# Altium footprint library DBLib.PcbLib: 92 footprints (part 6 of 6)
Each footprint in its own frame and in the unit in brackets; x right, y up, seen from the top. Pads: shape width x height; smd on the part's side, far side on the other; paste and mask are expansions set on the pad; w line width, h text height; cw(c..) or ccw(c..) is an arc to the next point about the centre after c.
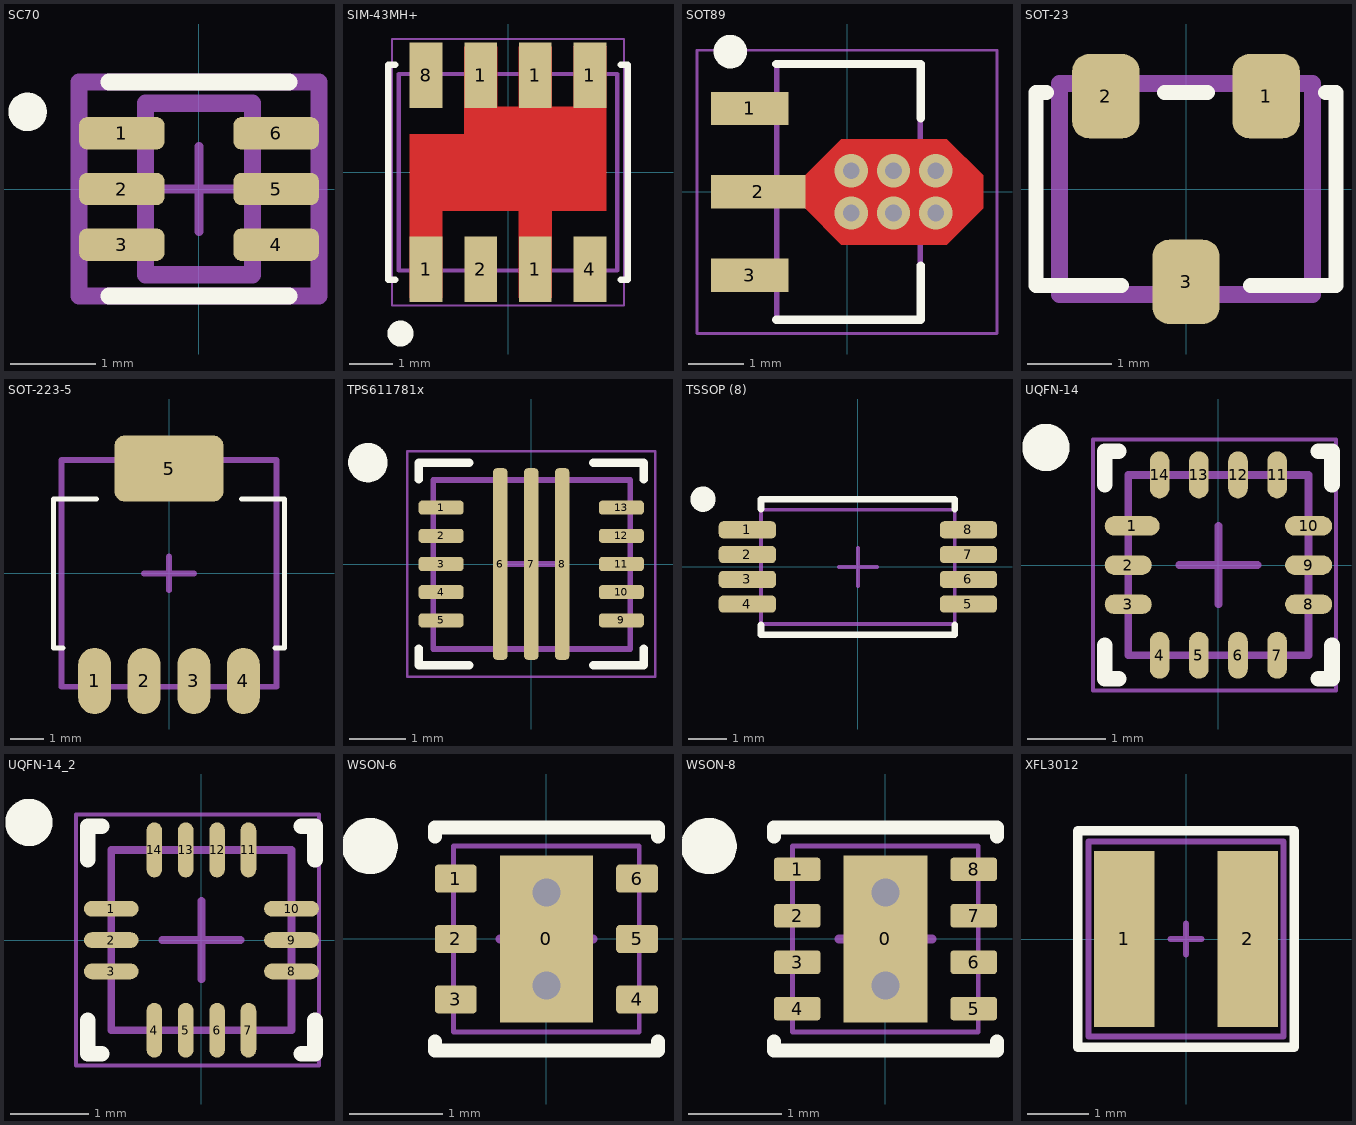
[diagram p5: the footprints below, top view; thin cyan lines are the x and y axes]

## SC70 [mm]
height 1
pads (6):
  rrect50% 1x0.376 smd paste+0 mask+0: 1(-0.9,0.65) 2(-0.9,0) 3(-0.9,-0.65) 4(0.9,-0.65) 5(0.9,0) 6(0.9,0.65)
Top Overlay:
  circle w0.25: c-2,0.9 r0.1
  lines w0.2: -1.05,-1.25 1.05,-1.25 ; -1.05,1.25 1.05,1.25
Mechanical 1:
  lines w0.2: -0.625,-1 0.625,-1 0.625,1 -0.625,1 -0.625,-1
Mechanical 13:
  lines w0.1: -0.5,0 0.5,0 ; 0,-0.5 0,0.5
  lines w0.2: -1.4,-1.25 -1.4,1.25 1.4,1.25 1.4,-1.25 -1.4,-1.25
3D body "IC_Analog_Devices_LT5534ESC6#TRMPBF_eec.STEP": height 1, standoff 0, extent -1.069,-1.003 1.031,0.997

## SIM-43MH+ [mm] "Frequency Mixer"
height 2.21
pads (8):
  rect 0.76x1.52 smd: 1(-1.905,-2.256) 1(-0.635,2.256) 1(0.635,-2.256) 1(0.635,2.256) 1(1.905,2.256) 2(-0.635,-2.256) 4(1.905,-2.256) 8(-1.905,2.256)
Top Layer:
  region: -1.016,2.921 -0.254,2.921 -0.254,1.524 0.254,1.524 0.254,2.921 1.016,2.921 1.016,1.524 1.524,1.524 1.524,2.921 2.286,2.921 2.286,-0.889 1.016,-0.889 1.016,-2.921 0.254,-2.921 0.254,-0.889 -1.524,-0.889 -1.524,-2.921 -2.286,-2.921 -2.286,0.889 -1.016,0.889
Top Overlay:
  circle w0.35: c-2.5,-3.75 r0.127
  lines w0.15: -2.626,-2.5 -2.786,-2.5 -2.786,2.5 -2.626,2.5 ; 2.626,-2.5 2.786,-2.5 2.786,2.5 2.626,2.5
Mechanical 1:
  lines w0.05: -2.7,-3.1 2.7,-3.1 2.7,3.1 -2.7,3.1 -2.7,-3.1
  lines w0.1: -0.5,0 0.5,0 ; 0,-0.5 0,0.5 ; -2.54,-2.285 -2.54,2.285 2.54,2.285 2.54,-2.285 -2.54,-2.285
3D body "SIM-73L+.stp": height 2.21, standoff -0.05, extent -2.54,-2.285 2.54,2.285

## SOT89 [mm] "SOT89, 3-Leads, Body 4,49x2,44mm, Pitch 1,50mm, Lead Span 4,0mm, IPC Medium Density"
height 1.6
pads (3):
  rect 1.4x0.6 smd: 1(-1.75,1.5) 3(-1.75,-1.5)
  rect 1.7x0.6 smd: 2(-1.6,0)
via 1.6,-0.381 diameter 0.6 hole 0.3
via 1.6,0.381 diameter 0.6 hole 0.3
via 0.838,0.381 diameter 0.6 hole 0.3
via 0.838,-0.381 diameter 0.6 hole 0.3
via 0.076,-0.381 diameter 0.6 hole 0.3
via 0.076,0.381 diameter 0.6 hole 0.3
Top Layer:
  region: -0.75,0.3 -0.1,0.95 1.8,0.95 2.45,0.3 2.45,-0.3 1.8,-0.95 -0.1,-0.95 -0.75,-0.3
Top Overlay:
  circle w0.35: c-2.1,2.525 r0.127
  lines w0.15: -1.272,-2.3 1.328,-2.3 1.328,-1.325 ; -1.272,2.3 1.328,2.3 1.328,1.325
Mechanical 1:
  lines w0.05: -2.7,-2.55 2.7,-2.55 2.7,2.55 -2.7,2.55 -2.7,-2.55
  lines w0.1: -0.473,0 0.527,0 ; 0.028,-0.5 0.028,0.5 ; -1.268,-2.3 1.322,-2.3 1.322,2.3 -1.268,2.3 -1.268,-2.3
Multi-Layer:
  region: -0.75,0.3 -0.1,0.95 1.8,0.95 2.45,0.3 2.45,-0.3 1.8,-0.95 -0.1,-0.95 -0.75,-0.3
3D body "User Library-SOT89-3.STEP": height 1.54, standoff 0, extent -2.222,-2.25 2.028,2.25

## SOT-23 [mm]
height 1
pads (3):
  rrect50% 0.8x1 smd: 1(0.95,1.1) 2(-0.95,1.1) 3(0,-1.1)
Top Overlay:
  lines w0.178: -1.651,1.143 -1.778,1.143 -1.778,-1.143 -0.762,-1.143 ; -0.254,1.143 0.254,1.143 ; 0.762,-1.143 1.778,-1.143 1.778,1.143 1.651,1.143
Mechanical 1:
  lines w0.2: -1.5,-1.25 -1.5,1.25 1.5,1.25 1.5,-1.25 -1.5,-1.25
3D body "SOT23-3_TO-236AB.step": height 1.09, standoff 0, extent -1.5,-1.25 1.5,1.25

## SOT-223-5 [mm]
height 1.8
pads (5):
  oval 1x2 smd: 1(-2.25,-3.252) 2(-0.75,-3.252) 3(0.75,-3.252) 4(2.25,-3.252)
  rrect30% 3.3x2 smd: 5(0,3.175)
Top Overlay:
  lines w0.15: -3.2,-2.252 -3.5,-2.252 -3.5,2.248 -2.2,2.248 ; 2.2,2.248 3.5,2.248 3.5,-2.252 3.2,-2.252
Mechanical 1:
  lines w0.178: -0.762,0 0.762,0 ; 0,-0.508 0,0.508 ; -3.25,-3.429 3.25,-3.429 3.25,3.429 -3.25,3.429 -3.25,-3.429
3D body "User Library-User Library-SOT-223-5.step": height 1.63, standoff -0.02, extent -3.25,-3.5 3.25,3.5

## TPS611781x [mm] "QFN, 24-Leads, Body 4,00x4,00mm, Pitch 0,50mm, PLASTIC SMALL OUTLINE - NO LEAD"
height 1
pads (13):
  rrect50% 0.8x0.25 smd: 1(-1.6,1) 2(-1.6,0.5) 3(-1.6,0) 4(-1.6,-0.5) 5(-1.6,-1) 9(1.6,-1) 10(1.6,-0.5) 11(1.6,0) 12(1.6,0.5) 13(1.6,1)
  rrect50% 0.25x3.4 smd: 6(-0.55,0) 7(0,0) 8(0.55,0)
Top Overlay:
  circle w0.35: c-2.9,1.8 r0.175
  lines w0.15: -2,-1.5 -2,-1.8 -1.1,-1.8 ; -2,1.5 -2,1.8 -1.1,1.8 ; 1.1,-1.8 2,-1.8 2,-1.5 ; 1.1,1.8 2,1.8 2,1.5
Mechanical 1:
  lines w0.05: -2.2,-2 -2.2,2 2.2,2 2.2,-2 -2.2,-2
  lines w0.1: -1.74,-1.51 -1.74,1.49 1.76,1.49 1.76,-1.51 -1.74,-1.51
Mechanical 15:
  lines w0.1: -0.5,0 0.5,0 ; 0,-0.5 0,0.5
3D body: height 1.02, standoff 1, extent -1.4,0.9 -1.2,1.1
3D body: height 1, standoff 0, extent -1.74,-1.51 1.76,1.49

## TSSOP (8) [mm] "TSSOP, 8-Leads"
height 1.2
pads (8):
  rrect50% 1.5x0.45 smd: 1(-2.9,0.975) 2(-2.9,0.325) 3(-2.9,-0.325) 4(-2.9,-0.975) 5(2.9,-0.975) 6(2.9,-0.325) 7(2.9,0.325) 8(2.9,0.975)
Top Overlay:
  circle w0.35: c-4.064,1.778 r0.156
  lines w0.178: -2.54,-1.524 -2.54,-1.778 2.54,-1.778 2.54,-1.524 ; -2.54,1.524 -2.54,1.778 2.54,1.778 2.54,1.524
Mechanical 1:
  lines w0.1: -0.5,0 0.5,0 ; 0,-0.5 0,0.5 ; -2.54,-1.5 2.54,-1.5 2.54,1.5 -2.54,1.5 -2.54,-1.5
3D body "User Library-TSSOP-8.STEP": height 1.2, standoff 0, extent -3.2,-1.5 3.2,1.5

## UQFN-14 [mm] "LMH5401"
height 0.6
pads (14):
  oval 0.7x0.25 smd: 1(-1.1,0.5)
  oval 0.6x0.25 smd: 2(-1.15,0) 3(-1.15,-0.5) 8(1.15,-0.5) 9(1.15,0) 10(1.15,0.5)
  oval 0.25x0.6 smd: 4(-0.75,-1.15) 5(-0.25,-1.15) 6(0.25,-1.15) 7(0.75,-1.15) 11(0.75,1.15) 12(0.25,1.15) 13(-0.25,1.15) 14(-0.75,1.15)
Top Overlay:
  circle w0.35: c-2.2,1.5 r0.127
  lines w0.2: -1.45,-1.025 -1.45,-1.45 -1.275,-1.45 ; -1.45,1.025 -1.45,1.45 -1.275,1.45 ; 1.275,-1.45 1.45,-1.45 1.45,-1.025 ; 1.275,1.45 1.45,1.45 1.45,1.025
Mechanical 1:
  lines w0.05: -1.6,-1.6 1.5,-1.6 1.5,1.6 -1.6,1.6 -1.6,-1.6
  lines w0.1: -0.5,0 0.5,0 ; 0,-0.5 0,0.5 ; -1.15,-1.15 1.15,-1.15 1.15,1.15 -1.15,1.15 -1.15,-1.15
3D body: height 0.6, standoff 0, extent -1.3,-1.3 1.3,1.3

## UQFN-14_2 [mm] "LMH6554"
height 0.6
pads (14):
  oval 0.7x0.2 smd: 1(-1.15,0.4) 2(-1.15,0) 3(-1.15,-0.4) 8(1.15,-0.4) 9(1.15,0) 10(1.15,0.4)
  oval 0.2x0.7 smd: 4(-0.6,-1.15) 5(-0.2,-1.15) 6(0.2,-1.15) 7(0.6,-1.15) 11(0.6,1.15) 12(0.2,1.15) 13(-0.2,1.15) 14(-0.6,1.15)
Top Overlay:
  circle w0.35: c-2.2,1.5 r0.127
  lines w0.2: -1.45,-1.025 -1.45,-1.45 -1.275,-1.45 ; -1.45,1.025 -1.45,1.45 -1.275,1.45 ; 1.275,-1.45 1.45,-1.45 1.45,-1.025 ; 1.275,1.45 1.45,1.45 1.45,1.025
Mechanical 1:
  lines w0.05: -1.6,-1.6 -1.6,1.6 1.5,1.6 1.5,-1.6 -1.6,-1.6
  lines w0.1: -0.5,0 0.5,0 ; 0,-0.5 0,0.5 ; -1.15,-1.15 -1.15,1.15 1.15,1.15 1.15,-1.15 -1.15,-1.15
3D body: height 0.6, standoff 0, extent -1.3,-1.3 1.3,1.3

## WSON-6 [mm] "PLASTIC SMALL OUTLINE - NO LEAD"
height 0.8
pads (7):
  rect 1x1.8 all layers, no hole mask+0.102: 0(0,0)
  rrect25% 0.45x0.3 smd: 1(-0.975,0.65) 2(-0.975,0) 3(-0.975,-0.65) 4(0.975,-0.65) 5(0.975,0) 6(0.975,0.65)
via 0,-0.5 diameter 0.6 hole 0.3
via 0,0.5 diameter 0.6 hole 0.3
Top Overlay:
  circle w0.35: c-1.9,1 r0.127
  lines w0.15: -1.2,-1.1 -1.2,-1.2 1.2,-1.2 1.2,-1.1 ; -1.2,1.1 -1.2,1.2 1.2,1.2 1.2,1.1
Top Paste:
  rectangle: -0.5,0.1 0.5,0.9
  rectangle: -0.5,-0.9 0.5,-0.1
Mechanical 1:
  lines w0.05: -1,-1 1,-1 1,1 -1,1 -1,-1
  lines w0.1: -0.5,0 0.5,0 ; 0,-0.5 0,0.5
3D body "User Library-wson6-drv.step": height 0.8, standoff 0, extent -1.01,-1 1.01,1

## WSON-8 [mm] "PLASTIC SMALL OUTLINE - NO LEAD"
height 0.8
pads (9):
  rect 0.9x1.8 all layers, no hole mask+0.102: 0(0,0)
  rrect25% 0.5x0.25 smd: 1(-0.95,0.75) 2(-0.95,0.25) 3(-0.95,-0.25) 4(-0.95,-0.75) 5(0.95,-0.75) 6(0.95,-0.25) 7(0.95,0.25) 8(0.95,0.75)
via 0,-0.5 diameter 0.6 hole 0.3
via 0,0.5 diameter 0.6 hole 0.3
Top Overlay:
  circle w0.35: c-1.9,1 r0.127
  lines w0.15: -1.2,-1.1 -1.2,-1.2 1.2,-1.2 1.2,-1.1 ; -1.2,1.1 -1.2,1.2 1.2,1.2 1.2,1.1
Top Paste:
  rectangle: -0.4,0.1 0.4,0.8
  rectangle: -0.4,-0.8 0.4,-0.1
Mechanical 1:
  lines w0.05: -1,-1 1,-1 1,1 -1,1 -1,-1
  lines w0.1: -0.5,0 0.5,0 ; 0,-0.5 0,0.5
3D body "User Library-SON8-2x2mm-1.step": height 0.79, standoff -0.01, extent -1,-1 1,1

## XFL3012 [mm]
height 1.3
pads (2):
  rect 1x2.9 smd: 1(-1.015,0) 2(1.015,0)
Top Overlay:
  lines w0.15: -1.778,-1.778 1.778,-1.778 1.778,1.778 -1.778,1.778 -1.778,-1.778
Mechanical 1:
  lines w0.1: -0.254,0 0.254,0 ; 0,-0.254 0,0.254 ; -1.6,-1.6 -1.6,1.6 1.6,1.6 1.6,-1.6 -1.6,-1.6
3D body "Coilcraft-XFL3012.step": height 1.25, standoff -0.05, extent -1.6,-1.6 1.6,1.6